# Altium footprint library Generic Footprint.PcbLib: 160 footprints (part 9 of 20) (continued)
## Symbol_CE-Logo-3x2mm_Silkscreen [mm] (continued)
1(1.139,0.104) 1(1.139,0.413) 1(1.145,0.107) 1(1.145,0.11) 1(1.145,0.113) 1(1.145,0.116) 1(1.145,0.119) 1(1.145,0.122) 1(1.145,0.125) 1(1.145,0.128) 1(1.145,0.131) 1(1.145,0.134) 1(1.145,0.137) 1(1.145,0.14) 1(1.145,0.143) 1(1.145,0.146) 1(1.145,0.149) 1(1.145,0.152) 1(1.145,0.155) 1(1.145,0.158) 1(1.145,0.161) 1(1.145,0.164) 1(1.145,0.167) 1(1.145,0.17) 1(1.145,0.173) 1(1.145,0.176) 1(1.145,0.179) 1(1.145,0.182) 1(1.145,0.185) 1(1.145,0.188) 1(1.145,0.191) 1(1.145,0.194) 1(1.145,0.197) 1(1.145,0.2) 1(1.145,0.203) 1(1.145,0.206) 1(1.145,0.209) 1(1.145,0.212) 1(1.145,0.215) 1(1.145,0.218) 1(1.145,0.221) 1(1.145,0.224) 1(1.145,0.227) 1(1.145,0.23) 1(1.145,0.233) 1(1.145,0.236) 1(1.145,0.239) 1(1.145,0.242) 1(1.145,0.245) 1(1.145,0.248) 1(1.145,0.251) 1(1.145,0.254) 1(1.145,0.257) 1(1.145,0.26) 1(1.145,0.263) 1(1.145,0.266) 1(1.145,0.269) 1(1.145,0.272) 1(1.145,0.275) 1(1.145,0.278) 1(1.145,0.281) 1(1.145,0.284) 1(1.145,0.287) 1(1.145,0.29) 1(1.145,0.293) 1(1.145,0.296) 1(1.145,0.299) 1(1.145,0.302) 1(1.145,0.305) 1(1.145,0.308) 1(1.145,0.311) 1(1.145,0.314) 1(1.145,0.317) 1(1.145,0.32) 1(1.145,0.323) 1(1.145,0.326) 1(1.145,0.329) 1(1.145,0.332) 1(1.145,0.335) 1(1.145,0.338) 1(1.145,0.341) 1(1.145,0.344) 1(1.145,0.347) 1(1.145,0.35) 1(1.145,0.353) 1(1.145,0.356) 1(1.145,0.359) 1(1.145,0.362) 1(1.145,0.365) 1(1.145,0.368) 1(1.145,0.371) 1(1.145,0.374) 1(1.145,0.377) 1(1.145,0.38) 1(1.145,0.383) 1(1.145,0.386) 1(1.145,0.389) 1(1.145,0.392) 1(1.145,0.395) 1(1.145,0.398) 1(1.145,0.401) 1(1.145,0.404) 1(1.145,0.407) 1(1.145,0.41) 1(1.145,0.413) 1(1.145,1.883) 1(1.145,1.886) 1(1.145,1.889) 1(1.145,1.892) 1(1.145,1.895) 1(1.145,1.898) 1(1.145,1.901) 1(1.145,1.904) 1(1.145,1.907) 1(1.145,1.91) 1(1.145,1.913) 1(1.145,1.916) 1(1.145,1.919) 1(1.145,1.922) 1(1.145,1.925) 1(1.145,1.928) 1(1.145,1.931) 1(1.145,1.934) 1(1.145,1.937) 1(1.145,1.94) 1(1.145,1.943) 1(1.145,1.946) 1(1.145,1.949) 1(1.145,1.952) 1(1.145,1.955) 1(1.145,1.958) 1(1.145,1.961) 1(1.145,1.964) 1(1.145,1.967) 1(1.145,1.97) 1(1.145,1.973) 1(1.145,1.976) 1(1.145,1.979) 1(1.145,1.982) 1(1.145,1.985) 1(1.145,1.988) 1(1.145,1.991) 1(1.145,1.994) 1(1.145,1.997) 1(1.145,2) 1(1.145,2.003) 1(1.145,2.006) 1(1.145,2.009) 1(1.145,2.012) 1(1.145,2.015) 1(1.145,2.018) 1(1.145,2.021) 1(1.145,2.024) 1(1.145,2.027) 1(1.145,2.03) 1(1.145,2.033) 1(1.145,2.036) 1(1.145,2.039) 1(1.145,2.042) 1(1.145,2.045) 1(1.145,2.048) 1(1.145,2.051) 1(1.145,2.054) 1(1.145,2.057) 1(1.145,2.06) 1(1.145,2.063) 1(1.145,2.066) 1(1.145,2.069) 1(1.145,2.072) 1(1.145,2.075) 1(1.145,2.078) 1(1.145,2.081) 1(1.145,2.084) 1(1.145,2.087) 1(1.145,2.09) 1(1.145,2.093) 1(1.145,2.096) 1(1.145,2.099) 1(1.145,2.102) 1(1.145,2.105) 1(1.145,2.108) 1(1.145,2.111) 1(1.145,2.114) 1(1.145,2.117) 1(1.145,2.12) 1(1.145,2.123) 1(1.145,2.126) 1(1.145,2.129) 1(1.145,2.132) 1(1.145,2.135) 1(1.145,2.138) 1(1.145,2.141) 1(1.145,2.144) 1(1.145,2.147) 1(1.145,2.15) 1(1.145,2.153) 1(1.145,2.156) 1(1.145,2.159) 1(1.145,2.162) 1(1.145,2.165) 1(1.145,2.168) 1(1.145,2.171) 1(1.145,2.174) 1(1.145,2.177) 1(1.145,2.18) 1(1.145,2.183) 1(1.148,2.186) 1(1.781,1.1) 1(1.781,1.103) 1(1.781,1.106) 1(1.781,1.109) 1(1.781,1.112) 1(1.781,1.16) 1(1.781,1.163) 1(1.781,1.166) 1(1.781,1.172) 1(1.781,1.175) 1(1.781,1.178) 1(1.781,1.181) 1(1.781,1.184) 1(1.781,1.187) 1(1.781,1.19) 1(1.781,1.193) 1(1.781,1.196) 1(1.784,1.097) 1(1.784,1.115) 1(1.784,1.118) 1(1.784,1.121) 1(1.784,1.124) 1(1.784,1.127) 1(1.784,1.13) 1(1.784,1.133) 1(1.784,1.136) 1(1.784,1.139) 1(1.784,1.142) 1(1.784,1.145) 1(1.784,1.148) 1(1.784,1.151) 1(1.784,1.154) 1(1.784,1.157) 1(1.787,1.04) 1(1.787,1.043) 1(1.787,1.046) 1(1.787,1.049) 1(1.787,1.052) 1(1.787,1.055) 1(1.787,1.058) 1(1.787,1.061) 1(1.787,1.064) 1(1.787,1.067) 1(1.787,1.07) 1(1.787,1.073) 1(1.787,1.076) 1(1.787,1.079) 1(1.787,1.082) 1(1.787,1.085) 1(1.787,1.088) 1(1.787,1.091) 1(1.787,1.094) 1(1.787,1.169) 1(1.787,1.199) 1(1.787,1.202) 1(1.787,1.205) 1(1.787,1.208) 1(1.787,1.211) 1(1.787,1.214) 1(1.787,1.217) 1(1.787,1.22) 1(1.787,1.223) 1(1.787,1.226) 1(1.787,1.229) 1(1.787,1.232) 1(1.787,1.235) 1(1.787,1.238) 1(1.787,1.241) 1(1.79,1.034) 1(1.79,1.037) 1(1.793,0.986) 1(1.793,0.989) 1(1.793,1.001) 1(1.793,1.01) 1(1.793,1.016) 1(1.793,1.019) 1(1.793,1.022) 1(1.793,1.028) 1(1.793,1.031) 1(1.793,1.244) 1(1.793,1.25) 1(1.793,1.256) 1(1.793,1.259) 1(1.793,1.262) 1(1.793,1.265) 1(1.793,1.268) 1(1.793,1.271) 1(1.793,1.274) 1(1.793,1.277) 1(1.793,1.283) 1(1.793,1.295) 1(1.793,1.304) 1(1.796,0.977) 1(1.796,0.98) 1(1.796,0.983) 1(1.796,0.992) 1(1.796,0.995) 1(1.796,0.998) 1(1.796,1.004) 1(1.796,1.007) 1(1.796,1.013) 1(1.796,1.025) 1(1.796,1.247) 1(1.796,1.253) 1(1.796,1.28) 1(1.796,1.286) 1(1.796,1.289) 1(1.796,1.292) 1(1.796,1.298) 1(1.796,1.301) 1(1.796,1.307) 1(1.799,0.968) 1(1.799,0.971) 1(1.799,0.974) 1(1.799,1.31) 1(1.799,1.313) 1(1.799,1.316) 1(1.799,1.319) 1(1.802,0.938) 1(1.802,0.941) 1(1.802,0.959) 1(1.802,1.322) 1(1.802,1.325) 1(1.802,1.331) 1(1.802,1.343) 1(1.802,1.349) 1(1.805,0.926) 1(1.805,0.929) 1(1.805,0.932) 1(1.805,0.935) 1(1.805,0.944) 1(1.805,0.947) 1(1.805,0.95) 1(1.805,0.953) 1(1.805,0.956) 1(1.805,0.962) 1(1.805,0.965) 1(1.805,1.328) 1(1.805,1.334) 1(1.805,1.337) 1(1.805,1.34) 1(1.805,1.346) 1(1.805,1.352) 1(1.805,1.355) 1(1.805,1.367) 1(1.808,0.92) 1(1.808,0.923) 1(1.808,1.358) 1(1.808,1.361) 1(1.808,1.364) 1(1.811,0.908) 1(1.811,0.917) 1(1.814,0.89) 1(1.814,0.893) 1(1.814,0.896) 1(1.814,0.899) 1(1.814,0.902) 1(1.814,0.905) 1(1.814,0.911) 1(1.814,0.914) 1(1.814,1.37) 1(1.814,1.373) 1(1.814,1.376) 1(1.814,1.379) 1(1.814,1.382) 1(1.814,1.385) 1(1.814,1.388) 1(1.814,1.391) 1(1.814,1.394) 1(1.814,1.403) 1(1.817,0.881) 1(1.817,0.884) 1(1.817,0.887) 1(1.817,1.397) 1(1.817,1.4) 1(1.82,0.878) 1(1.82,1.406) 1(1.823,0.851) 1(1.823,0.857) 1(1.823,0.86) 1(1.823,0.863) 1(1.823,0.866) 1(1.823,0.869) 1(1.823,0.872) 1(1.823,0.875) 1(1.823,1.409) 1(1.823,1.412) 1(1.823,1.415) 1(1.823,1.418) 1(1.823,1.421) 1(1.823,1.424) 1(1.823,1.43) 1(1.823,1.433) 1(1.826,0.854) 1(1.826,1.427) 1(1.832,0.83) 1(1.832,0.839) 1(1.832,0.842) 1(1.832,0.845) 1(1.832,0.848) 1(1.832,1.436) 1(1.832,1.448) 1(1.835,0.821) 1(1.835,0.824) 1(1.835,0.827) 1(1.835,0.833) 1(1.835,0.836) 1(1.835,1.439) 1(1.835,1.442) 1(1.835,1.445) 1(1.835,1.451) 1(1.835,1.454) 1(1.835,1.457) 1(1.835,1.46) 1(1.835,1.463) 1(1.841,0.797) 1(1.841,0.815) 1(1.841,1.466) 1(1.841,1.469) 1(1.841,1.472) 1(1.841,1.481) 1(1.844,0.794) 1(1.844,0.8) 1(1.844,0.803) 1(1.844,0.806) 1(1.844,0.809) 1(1.844,0.812) 1(1.844,0.818) 1(1.844,1.475) 1(1.844,1.478) 1(1.844,1.484) 1(1.844,1.487) 1(1.844,1.49) 1(1.844,1.493) 1(1.85,0.791) 1(1.853,0.767) 1(1.853,0.77) 1(1.853,0.773) 1(1.853,0.776) 1(1.853,0.779) 1(1.853,0.782) 1(1.853,0.785) 1(1.853,0.788) 1(1.853,1.496) 1(1.853,1.499) 1(1.853,1.502) 1(1.853,1.505) 1(1.853,1.508) 1(1.853,1.511) 1(1.853,1.514) 1(1.853,1.517) 1(1.856,0.764) 1(1.856,1.52) 1(1.859,1.523) 1(1.862,0.743) 1(1.862,0.746) 1(1.862,0.749) 1(1.862,0.752) 1(1.862,0.755) 1(1.862,0.758) 1(1.862,0.761) 1(1.862,1.526) 1(1.862,1.529) 1(1.862,1.532) 1(1.862,1.535) 1(1.862,1.538) 1(1.862,1.541) 1(1.865,0.737) 1(1.865,0.74) 1(1.871,0.719) 1(1.871,0.728) 1(1.871,0.734) 1(1.871,1.544) 1(1.871,1.547) 1(1.871,1.55) 1(1.871,1.553) 1(1.871,1.556) 1(1.871,1.559) 1(1.874,0.722) 1(1.874,0.725) 1(1.874,0.731) 1(1.874,1.562) 1(1.874,1.565) 1(1.874,1.568) 1(1.877,0.716) 1(1.88,0.698) 1(1.88,0.704) 1(1.88,0.71) 1(1.88,0.713) 1(1.88,1.571) 1(1.88,1.58) 1(1.883,0.701) 1(1.883,0.707) 1(1.883,1.574) 1(1.883,1.577) 1(1.883,1.583) 1(1.883,1.586) 1(1.883,1.589) 1(1.886,0.695) 1(1.889,0.692) 1(1.892,0.68) 1(1.892,0.683) 1(1.892,0.686) 1(1.892,0.689) 1(1.892,1.592) 1(1.892,1.595) 1(1.892,1.598) 1(1.892,1.601) 1(1.892,1.604) 1(1.892,1.607) 1(1.895,0.677) 1(1.898,0.668) 1(1.898,1.61) 1(1.901,0.659) 1(1.901,0.662) 1(1.901,0.665) 1(1.901,0.671) 1(1.901,0.674) 1(1.901,1.613) 1(1.901,1.616) 1(1.901,1.619) 1(1.901,1.622) 1(1.901,1.625) 1(1.904,1.628) 1(1.91,0.644) 1(1.91,0.647) 1(1.91,0.65) 1(1.91,0.653) 1(1.91,0.656) 1(1.91,1.631) 1(1.91,1.634) 1(1.91,1.637) 1(1.91,1.64) 1(1.913,0.638) 1(1.913,0.641) 1(1.913,1.643) 1(1.913,1.646) 1(1.919,0.623) 1(1.919,0.626) 1(1.919,1.649) 1(1.922,0.629) 1(1.922,0.632) 1(1.922,0.635) 1(1.922,1.652) 1(1.922,1.655) 1(1.925,0.62) 1(1.928,1.658) 1(1.928,1.664) 1(1.931,0.611) 1(1.931,0.614) 1(1.931,0.617) 1(1.931,1.661) 1(1.931,1.667) 1(1.931,1.67) 1(1.931,1.673) 1(1.931,1.676) 1(1.937,0.599) 1(1.937,0.602) 1(1.937,0.608) 1(1.937,1.682) 1(1.94,0.593) 1(1.94,0.596) 1(1.94,0.605) 1(1.94,1.679) 1(1.94,1.685) 1(1.94,1.688) 1(1.94,1.691) 1(1.94,1.694) 1(1.946,0.59) 1(1.949,0.581) 1(1.949,0.584) 1(1.949,0.587) 1(1.949,1.697) 1(1.949,1.7) 1(1.949,1.703) 1(1.958,0.563) 1(1.958,0.566) 1(1.958,0.569) 1(1.958,0.572) 1(1.958,0.575) 1(1.958,0.578) 1(1.958,1.706) 1(1.958,1.709) 1(1.958,1.712) 1(1.958,1.715) 1(1.958,1.718) 1(1.958,1.721) 1(1.958,1.724) 1(1.967,0.56) 1(1.967,1.727) 1(1.967,1.733) 1(1.97,0.554) 1(1.97,0.557) 1(1.97,1.73) 1(1.973,0.551) 1(1.976,0.539) 1(1.976,0.545) 1(1.976,0.548) 1(1.976,1.736) 1(1.976,1.742) 1(1.979,0.533) 1(1.979,0.536) 1(1.979,0.542) 1(1.979,1.739) 1(1.979,1.745) 1(1.979,1.748) 1(1.979,1.751) 1(1.982,1.754) 1(1.988,0.524) 1(1.988,0.527) 1(1.988,0.53) 1(1.988,1.757) 1(1.988,1.76) 1(1.988,1.763) 1(1.994,1.766) 1(1.997,0.515) 1(1.997,0.518) 1(1.997,0.521) 1(1.997,1.769) 1(1.997,1.772) 1(2.006,0.503) 1(2.006,0.506) 1(2.006,0.512) 1(2.006,1.775) 1(2.006,1.778) 1(2.006,1.781) 1(2.006,1.784) 1(2.009,0.497) 1(2.009,0.5) 1(2.009,0.509) 1(2.009,1.787) 1(2.009,1.79) 1(2.012,0.494) 1(2.015,0.488) 1(2.015,0.491) 1(2.015,1.793) 1(2.018,0.485) 1(2.018,1.796) 1(2.018,1.799) 1(2.021,1.802) 1(2.027,0.476) 1(2.027,0.479) 1(2.027,0.482) 1(2.027,1.805) 1(2.027,1.808) 1(2.027,1.811) 1(2.03,0.473) 1(2.036,0.467) 1(2.036,0.47) 1(2.036,1.814) 1(2.036,1.817) 1(2.036,1.82) 1(2.039,0.464) 1(2.045,0.455) 1(2.045,0.458) 1(2.045,0.461) 1(2.045,1.823) 1(2.045,1.826) 1(2.045,1.829) 1(2.054,0.452) 1(2.054,1.832) 1(2.054,1.838) 1(2.057,0.446) 1(2.057,0.449) 1(2.057,1.835) 1(2.063,0.434) 1(2.063,0.437) 1(2.063,0.44) 1(2.063,0.443) 1(2.063,1.841) 1(2.063,1.847) 1(2.066,0.425) 1(2.066,0.428) 1(2.066,0.431) 1(2.066,1.844) 1(2.066,1.85) 1(2.066,1.853) 1(2.066,1.856) 1(2.069,1.859) 1(2.072,0.422) 1(2.075,0.419) 1(2.075,1.862) 1(2.075,1.865) 1(2.075,1.868) 1(2.078,0.416) 1(2.081,0.413) 1(2.081,1.871) 1(2.084,0.41) 1(2.084,1.874) 1(2.084,1.877) 1(2.093,0.401) 1(2.093,0.404) 1(2.093,0.407) 1(2.093,1.88) 1(2.093,1.883) 1(2.093,1.886) 1(2.096,0.398) 1(2.102,0.392) 1(2.102,0.395) 1(2.102,1.889) 1(2.105,0.389) 1(2.105,1.892) 1(2.105,1.895) 1(2.105,1.898) 1(2.108,0.977) 1(2.108,0.986) 1(2.108,0.989) 1(2.108,1.304) 1(2.108,1.307) 1(2.111,0.386) 1(2.111,0.974) 1(2.111,0.98) 1(2.111,0.983) 1(2.111,0.992) 1(2.111,1.301) 1(2.111,1.31) 1(2.114,0.377) 1(2.114,0.38) 1(2.114,0.383) 1(2.114,0.971) 1(2.114,1.313) 1(2.114,1.316) 1(2.114,1.319) 1(2.114,1.901) 1(2.114,1.904) 1(2.117,0.965) 1(2.117,0.995) 1(2.117,1.322) 1(2.117,1.325) 1(2.117,1.907) 1(2.12,0.938) 1(2.12,0.941) 1(2.12,0.944) 1(2.12,0.947) 1(2.12,0.95) 1(2.12,0.953) 1(2.12,0.956) 1(2.12,0.959) 1(2.12,0.962) 1(2.12,0.968) 1(2.12,0.995) 1(2.12,1.301) 1(2.12,1.328) 1(2.12,1.331) 1(2.12,1.334) 1(2.12,1.337) 1(2.12,1.34) 1(2.12,1.343) 1(2.12,1.346) 1(2.12,1.349) 1(2.123,0.374) 1(2.123,0.935) 1(2.123,0.992) 1(2.123,1.301) 1(2.123,1.352) 1(2.126,0.371) 1(2.126,0.932) 1(2.126,0.992) 1(2.126,1.355) 1(2.126,1.358) 1(2.129,0.368) 1(2.129,0.905) 1(2.129,0.908) 1(2.129,0.911) 1(2.129,0.914) 1(2.129,0.917) 1(2.129,0.92) 1(2.129,0.923) 1(2.129,0.926) 1(2.129,0.929) 1(2.129,1.361) 1(2.129,1.364) 1(2.129,1.367) 1(2.129,1.37) 1(2.129,1.373) 1(2.129,1.376) 1(2.129,1.379) 1(2.132,1.91) 1(2.132,1.913) 1(2.132,1.916) 1(2.135,1.382) 1(2.135,1.385) 1(2.138,0.881) 1(2.138,0.884) 1(2.138,0.887) 1(2.138,0.89) 1(2.138,0.893) 1(2.138,0.896) 1(2.138,0.899) 1(2.138,0.902) 1(2.138,1.388) 1(2.138,1.391) 1(2.138,1.394) 1(2.138,1.397) 1(2.138,1.4) 1(2.138,1.403) 1(2.138,1.406) 1(2.138,1.409) 1(2.141,0.359) 1(2.141,0.362) 1(2.141,0.365) 1(2.141,0.878) 1(2.141,1.919) 1(2.141,1.922) 1(2.141,1.925) 1(2.144,1.412) 1(2.147,0.86) 1(2.147,0.863) 1(2.147,0.866) 1(2.147,0.869) 1(2.147,0.872) 1(2.147,1.415) 1(2.147,1.418) 1(2.147,1.421) 1(2.147,1.424) 1(2.147,1.427) 1(2.147,1.43) 1(2.147,1.433) 1(2.147,1.436) 1(2.15,0.35) 1(2.15,0.353) 1(2.15,0.356) 1(2.15,0.857) 1(2.15,0.875) 1(2.15,1.439) 1(2.15,1.928) 1(2.15,1.931) 1(2.15,1.934) 1(2.15,1.937) 1(2.153,0.857) 1(2.153,1.439) 1(2.153,1.937) 1(2.156,0.848) 1(2.156,0.851) 1(2.156,0.854) 1(2.156,0.857) 1(2.156,1.439) 1(2.159,0.347) 1(2.159,0.83) 1(2.159,0.833) 1(2.159,0.836) 1(2.159,0.839) 1(2.159,0.842) 1(2.159,0.845) 1(2.159,1.442) 1(2.159,1.445) 1(2.159,1.448) 1(2.159,1.451) 1(2.159,1.454) 1(2.159,1.457) 1(2.159,1.937) 1(2.159,1.94) 1(2.159,1.943) 1(2.162,0.341) 1(2.162,0.344) 1(2.162,1.946) 1(2.168,0.809) 1(2.168,0.812) 1(2.168,0.815) 1(2.168,0.818) 1(2.168,0.821) 1(2.168,0.824) 1(2.168,0.827) 1(2.168,1.46) 1(2.168,1.463) 1(2.168,1.466) 1(2.168,1.469) 1(2.168,1.472) 1(2.168,1.475) 1(2.171,0.332) 1(2.171,0.335) 1(2.171,0.338) 1(2.171,1.949) 1(2.171,1.952) 1(2.171,1.955) 1(2.174,0.329) 1(2.174,1.478) 1(2.177,0.329) 1(2.177,0.791) 1(2.177,0.794) 1(2.177,0.797) 1(2.177,0.8) 1(2.177,0.803) 1(2.177,0.806) 1(2.177,1.481) 1(2.177,1.484) 1(2.177,1.487) 1(2.177,1.49) 1(2.177,1.493) 1(2.18,0.323) 1(2.18,0.326) 1(2.18,0.329) 1(2.18,1.958) 1(2.18,1.961) 1(2.183,0.32) 1(2.183,1.496) 1(2.183,1.964) 1(2.186,0.782) 1(2.186,0.785) 1(2.186,0.788) 1(2.186,1.499) 1(2.186,1.502) 1(2.186,1.505) 1(2.186,1.511) 1(2.186,1.514) 1(2.189,1.508) 1(2.192,0.32) 1(2.192,0.779) 1(2.195,0.32) 1(2.195,0.764) 1(2.195,0.77) 1(2.195,0.773) 1(2.195,0.776) 1(2.195,1.517) 1(2.195,1.52) 1(2.195,1.523) 1(2.198,0.311) 1(2.198,0.317) 1(2.198,0.761) 1(2.198,0.767) 1(2.198,1.526) 1(2.198,1.967) 1(2.198,1.97) 1(2.198,1.973) 1(2.201,0.314) 1(2.204,0.758) 1(2.207,0.308) 1(2.207,0.743) 1(2.207,0.746) 1(2.207,0.749) 1(2.207,0.752) 1(2.207,0.755) 1(2.207,1.529) 1(2.207,1.532) 1(2.207,1.535) 1(2.207,1.538) 1(2.207,1.541) 1(2.207,1.544) 1(2.207,1.976) 1(2.21,0.302) 1(2.21,0.305) 1(2.21,1.979) 1(2.21,1.982) 1(2.21,1.985) 1(2.216,0.734) 1(2.216,0.737) 1(2.216,0.74) 1(2.216,1.547) 1(2.216,1.55) 1(2.216,1.553) 1(2.216,1.988) 1(2.219,0.293) 1(2.219,0.296) 1(2.219,0.299) 1(2.219,1.991) 1(2.222,0.731) 1(2.222,1.556) 1(2.222,1.994) 1(2.225,0.713) 1(2.225,0.716) 1(2.225,0.719) 1(2.225,0.722) 1(2.225,0.725) 1(2.225,0.728) 1(2.225,1.559) 1(2.225,1.562) 1(2.225,1.565) 1(2.225,1.568) 1(2.225,1.571) 1(2.228,0.29) 1(2.231,0.29) 1(2.231,1.574) 1(2.234,0.29) 1(2.234,0.707) 1(2.234,0.71) 1(2.234,1.577) 1(2.234,1.58) 1(2.237,0.284) 1(2.237,0.704) 1(2.237,1.997) 1(2.237,2) 1(2.237,2.003) 1(2.24,0.281) 1(2.24,0.287) 1(2.24,1.583) 1(2.243,0.701) 1(2.243,1.586) 1(2.243,1.589) 1(2.243,1.598) 1(2.246,0.278) 1(2.246,0.695) 1(2.246,0.698) 1(2.246,1.592) 1(2.246,1.595) 1(2.246,1.601) 1(2.246,2.006) 1(2.249,0.275) 1(2.249,2.009) 1(2.249,2.012) 1(2.252,0.272) 1(2.252,0.689) 1(2.252,0.692) 1(2.255,0.674) 1(2.255,0.677) 1(2.255,0.68) 1(2.255,0.683) 1(2.255,0.686) 1(2.255,1.604) 1(2.255,1.607) 1(2.255,1.61) 1(2.258,0.272) 1(2.261,0.272) 1(2.264,0.668) 1(2.264,0.671) 1(2.264,1.613) 1(2.264,1.616) 1(2.264,1.619) 1(2.264,2.015) 1(2.267,0.263) 1(2.267,0.266) 1(2.267,0.269) 1(2.267,0.665) 1(2.267,1.622) 1(2.267,2.018) 1(2.267,2.021) 1(2.27,1.622) 1(2.273,0.656) 1(2.273,0.659) 1(2.273,0.662) 1(2.273,1.622) 1(2.273,1.625) 1(2.273,1.628) 1(2.273,2.024) 1(2.276,0.257) 1(2.276,0.26) 1(2.276,2.027) 1(2.276,2.03) 1(2.279,1.631) 1(2.279,2.033) 1(2.282,0.254) 1(2.282,0.65) 1(2.282,0.653) 1(2.282,1.634) 1(2.282,1.637) 1(2.285,0.647) 1(2.285,1.64) 1(2.291,0.638) 1(2.291,0.644) 1(2.291,1.643) 1(2.291,1.649) 1(2.294,0.251) 1(2.294,0.641) 1(2.294,1.646) 1(2.294,2.036) 1(2.294,2.039) 1(2.297,0.245) 1(2.297,0.248) 1(2.297,0.635) 1(2.297,2.042) 1(2.3,0.635) 1(2.3,1.652) 1(2.303,0.626) 1(2.303,0.629) 1(2.303,0.632) 1(2.303,0.635) 1(2.303,1.655) 1(2.303,1.658) 1(2.303,2.045) 1(2.306,0.242) 1(2.306,1.661) 1(2.306,2.048) 1(2.309,0.242) 1(2.309,0.992) 1(2.309,2.051) 1(2.312,0.242) 1(2.312,0.617) 1(2.312,0.62) 1(2.312,0.623) 1(2.312,0.992) 1(2.312,1.664) 1(2.312,1.667) 1(2.315,0.233) 1(2.315,0.236) 1(2.315,0.239) 1(2.315,1.67) 1(2.321,0.608) 1(2.321,0.611) 1(2.321,0.614) 1(2.321,0.992) 1(2.321,1.673) 1(2.321,1.676) 1(2.321,1.679) 1(2.321,2.054) 1(2.324,0.23) 1(2.324,2.057) 1(2.324,2.06) 1(2.327,0.227) 1(2.327,0.992) 1(2.33,0.605) 1(2.33,0.992) 1(2.33,1.682) 1(2.33,1.685) 1(2.333,0.599) 1(2.333,0.602) 1(2.333,0.992) 1(2.333,1.688) 1(2.336,0.224) 1(2.336,2.063) 1(2.339,2.063) 1(2.342,0.587) 1(2.342,0.59) 1(2.342,0.593) 1(2.342,0.596) 1(2.342,1.691) 1(2.342,1.694) 1(2.342,1.697) 1(2.345,0.218) 1(2.345,0.221) 1(2.345,2.063) 1(2.345,2.066) 1(2.345,2.069) 1(2.348,0.215) 1(2.351,0.578) 1(2.351,0.581) 1(2.351,0.584) 1(2.351,1.7) 1(2.351,1.703) 1(2.351,1.706) 1(2.351,2.072) 1(2.357,0.992) 1(2.36,0.569) 1(2.36,0.572) 1(2.36,0.575) 1(2.36,0.992) 1(2.36,1.709) 1(2.36,1.712) 1(2.36,1.715) 1(2.36,2.072) 1(2.363,0.209) 1(2.363,0.212) 1(2.363,1.718) 1(2.363,2.072) 1(2.363,2.075) 1(2.366,0.206) 1(2.366,1.718) 1(2.366,2.078) 1(2.366,2.081) 1(2.369,0.992) 1(2.369,1.718) 1(2.369,1.721) 1(2.369,1.724) 1(2.372,1.727) 1(2.375,0.992) 1(2.378,0.563) 1(2.378,0.566) 1(2.381,0.2) 1(2.381,0.203) 1(2.381,0.56) 1(2.381,2.084) 1(2.384,2.087) 1(2.384,2.09) 1(2.387,0.197) 1(2.387,0.557) 1(2.387,1.73) 1(2.39,0.551) 1(2.39,0.554) 1(2.39,1.733) 1(2.39,1.736) 1(2.393,0.194) 1(2.396,0.194) 1(2.399,0.194) 1(2.399,0.539) 1(2.399,0.542) 1(2.399,0.545) 1(2.399,0.548) 1(2.399,1.739) 1(2.399,1.742) 1(2.399,1.745) 1(2.402,0.191) 1(2.402,1.748) 1(2.402,2.093) 1(2.402,2.096) 1(2.405,0.188) 1(2.405,1.748) 1(2.405,2.099) 1(2.408,1.748) 1(2.408,1.751) 1(2.408,1.754) 1(2.411,0.185) 1(2.411,1.757) 1(2.414,1.757) 1(2.417,0.533) 1(2.417,0.536) 1(2.42,0.53) 1(2.42,2.102) 1(2.423,2.105) 1(2.426,1.757) 1(2.426,1.763) 1(2.426,2.108) 1(2.426,2.111) 1(2.429,0.176) 1(2.429,0.179) 1(2.429,0.182) 1(2.429,0.521) 1(2.429,0.524) 1(2.429,0.527) 1(2.429,1.76) 1(2.429,1.766) 1(2.429,2.111) 1(2.432,0.176) 1(2.432,1.766) 1(2.435,0.176) 1(2.438,1.766) 1(2.438,1.769) 1(2.438,1.772) 1(2.438,1.775) 1(2.444,0.518) 1(2.447,0.512) 1(2.447,0.515) 1(2.447,2.111) 1(2.45,0.17) 1(2.45,0.173) 1(2.45,2.114) 1(2.45,2.117) 1(2.453,0.167) 1(2.456,1.778) 1(2.456,1.781) 1(2.456,1.784) 1(2.456,2.12) 1(2.459,0.509) 1(2.465,0.506) 1(2.468,0.503) 1(2.471,0.5) 1(2.471,2.123) 1(2.471,2.126) 1(2.474,0.5) 1(2.474,1.787) 1(2.477,0.164) 1(2.477,0.491) 1(2.477,0.494) 1(2.477,0.497) 1(2.477,0.5) 1(2.477,1.79) 1(2.477,1.793) 1(2.477,1.796) 1(2.477,2.129) 1(2.48,0.158) 1(2.48,0.161) 1(2.48,1.796) 1(2.486,1.796) 1(2.495,0.482) 1(2.495,0.485) 1(2.495,0.488) 1(2.495,1.799) 1(2.495,1.802) 1(2.498,2.132) 1(2.498,2.135) 1(2.501,1.805) 1(2.501,2.138) 1(2.507,0.149) 1(2.507,0.152) 1(2.507,0.155) 1(2.51,1.808) 1(2.516,0.146) 1(2.516,0.473) 1(2.516,0.476) 1(2.516,0.479) 1(2.516,1.811) 1(2.519,1.814) 1(2.525,2.141) 1(2.525,2.144) 1(2.528,0.47) 1(2.531,0.47) 1(2.531,0.992) 1(2.531,2.147) 1(2.534,0.464) 1(2.534,0.467) 1(2.534,0.47) 1(2.534,0.992) 1(2.534,1.817) 1(2.534,1.82) 1(2.537,0.14) 1(2.537,0.143) 1(2.537,1.823) 1(2.546,0.992) 1(2.549,0.137) 1(2.549,0.992) 1(2.552,1.826) 1(2.552,1.829) 1(2.552,1.832) 1(2.552,2.15) 1(2.555,0.461) 1(2.555,2.15) 1(2.561,0.458) 1(2.564,0.134) 1(2.564,0.452) 1(2.564,0.455) 1(2.564,2.15) 1(2.564,2.153) 1(2.564,2.156) 1(2.567,0.131) 1(2.567,1.835) 1(2.57,0.452) 1(2.57,0.992) 1(2.57,1.835) 1(2.573,0.992) 1(2.576,0.128) 1(2.576,0.452) 1(2.576,1.835) 1(2.579,0.128) 1(2.579,2.159) 1(2.582,1.838) 1(2.585,0.128) 1(2.585,0.449) 1(2.585,1.841) 1(2.591,0.443) 1(2.591,0.446) 1(2.594,2.162) 1(2.597,1.844) 1(2.603,0.125) 1(2.606,0.122) 1(2.606,2.165) 1(2.609,0.44) 1(2.609,1.847) 1(2.612,1.85) 1(2.612,2.168) 1(2.621,0.119) 1(2.621,0.434) 1(2.621,0.437) 1(2.621,1.853) 1(2.636,1.856) 1(2.639,1.859) 1(2.642,1.862) 1(2.642,2.171) 1(2.645,0.431) 1(2.645,1.862) 1(2.645,2.174) 1(2.648,1.862) 1(2.651,0.113) 1(2.651,0.116) 1(2.651,0.425) 1(2.651,0.428) 1(2.657,2.177) 1(2.66,0.107) 1(2.66,0.11) 1(2.663,0.107) 1(2.663,0.11) 1(2.666,0.107) 1(2.666,0.11) 1(2.672,0.107) 1(2.672,1.865) 1(2.675,1.862) 1(2.675,1.865) 1(2.678,1.862) 1(2.678,1.865) 1(2.678,1.868) 1(2.678,1.871) 1(2.684,0.422) 1(2.687,0.107) 1(2.693,0.419) 1(2.699,0.104) 1(2.699,0.413) 1(2.699,0.416) 1(2.699,2.18) 1(2.699,2.183) 1(2.699,2.186) 1(2.702,0.104) 1(2.705,0.101) 1(2.705,0.104) 1(2.705,2.186) 1(2.708,0.101) 1(2.708,0.104) 1(2.708,0.107) 1(2.711,0.107) 1(2.711,0.413) 1(2.711,1.874) 1(2.714,0.107) 1(2.714,0.413) 1(2.714,2.186) 1(2.717,0.107) 1(2.717,0.413) 1(2.723,0.413) 1(2.726,0.413) 1(2.726,1.265) 1(2.726,1.271) 1(2.729,0.104) 1(2.732,0.413) 1(2.732,0.995) 1(2.732,0.998) 1(2.732,1.001) 1(2.732,1.004) 1(2.732,1.007) 1(2.732,1.01) 1(2.732,1.013) 1(2.732,1.016) 1(2.732,1.019) 1(2.732,1.022) 1(2.732,1.025) 1(2.732,1.028) 1(2.732,1.031) 1(2.732,1.034) 1(2.732,1.037) 1(2.732,1.04) 1(2.732,1.043) 1(2.732,1.046) 1(2.732,1.049) 1(2.732,1.052) 1(2.732,1.055) 1(2.732,1.058) 1(2.732,1.061) 1(2.732,1.064) 1(2.732,1.067) 1(2.732,1.07) 1(2.732,1.073) 1(2.732,1.076) 1(2.732,1.079) 1(2.732,1.082) 1(2.732,1.085) 1(2.732,1.088) 1(2.732,1.091) 1(2.732,1.094) 1(2.732,1.097) 1(2.732,1.1) 1(2.732,1.103) 1(2.732,1.106) 1(2.732,1.109) 1(2.732,1.112) 1(2.732,1.115) 1(2.732,1.118) 1(2.732,1.121) 1(2.732,1.124) 1(2.732,1.127) 1(2.732,1.13) 1(2.732,1.133) 1(2.732,1.136) 1(2.732,1.139) 1(2.732,1.142) 1(2.732,1.145) 1(2.732,1.148) 1(2.732,1.151) 1(2.732,1.154) 1(2.732,1.157) 1(2.732,1.16) 1(2.732,1.163) 1(2.732,1.166) 1(2.732,1.169) 1(2.732,1.172) 1(2.732,1.175) 1(2.732,1.178) 1(2.732,1.181) 1(2.732,1.184) 1(2.732,1.187) 1(2.732,1.19) 1(2.732,1.193) 1(2.732,1.196) 1(2.732,1.199) 1(2.732,1.202) 1(2.732,1.205) 1(2.732,1.208) 1(2.732,1.211) 1(2.732,1.214) 1(2.732,1.217) 1(2.732,1.22) 1(2.732,1.223) 1(2.732,1.226) 1(2.732,1.229) 1(2.732,1.232) 1(2.732,1.235) 1(2.732,1.238) 1(2.732,1.241) 1(2.732,1.244) 1(2.732,1.247) 1(2.732,1.25) 1(2.732,1.253) 1(2.732,1.256) 1(2.732,1.259) 1(2.732,1.262) 1(2.732,1.268) 1(2.732,1.274) 1(2.732,1.277) 1(2.732,1.28) 1(2.732,1.283) 1(2.732,1.286) 1(2.732,1.289) 1(2.732,1.292) 1(2.732,1.295) 1(2.732,1.298) 1(2.735,1.877) 1(2.738,1.88) 1(2.747,0.413) 1(2.747,1.883) 1(2.75,1.883) 1(2.756,0.101) 1(2.756,0.41) 1(2.756,0.413) 1(2.765,2.189) 1(2.774,0.098) 1(2.774,0.407) 1(2.777,0.404) 1(2.777,2.189) 1(2.78,0.098) 1(2.78,1.883) 1(2.783,0.098) 1(2.783,1.883) 1(2.786,1.88) 1(2.789,2.189) 1(2.792,2.189) 1(2.795,0.098) 1(2.795,1.88) 1(2.795,2.189) 1(2.798,0.098) 1(2.798,1.883) 1(2.801,0.098) 1(2.804,0.098) 1(2.804,0.404) 1(2.807,0.095) 1(2.81,0.095) 1(2.81,2.189) 1(2.819,2.189) 1(2.825,2.189) 1(2.834,2.189) 1(2.852,2.192) 1(2.858,0.095) 1(2.861,0.095) 1(2.861,2.192) 1(2.864,0.098) 1(2.864,2.189) 1(2.867,0.098) 1(2.867,2.189) 1(2.87,2.189) 1(2.873,2.189) 1(2.879,1.883) 1(2.882,0.404) 1(2.882,1.88) 1(2.891,0.404) 1(2.894,0.098) 1(2.894,0.407) 1(2.894,1.88) 1(2.894,1.883) 1(2.897,1.883) 1(2.9,2.189) 1(2.903,0.098) 1(2.906,0.098) 1(2.909,2.189) 1(2.912,0.41) 1(2.912,0.413) 1(2.912,2.189) 1(2.921,0.413) 1(2.924,0.101) 1(2.936,0.104) 1(2.936,0.107) 1(2.936,0.11) 1(2.936,0.113) 1(2.936,0.116) 1(2.936,0.119) 1(2.936,0.122) 1(2.936,0.125) 1(2.936,0.128) 1(2.936,0.131) 1(2.936,0.134) 1(2.936,0.137) 1(2.936,0.14) 1(2.936,0.143) 1(2.936,0.146) 1(2.936,0.149) 1(2.936,0.152) 1(2.936,0.155) 1(2.936,0.158) 1(2.936,0.161) 1(2.936,0.164) 1(2.936,0.167) 1(2.936,0.17) 1(2.936,0.173) 1(2.936,0.176) 1(2.936,0.179) 1(2.936,0.182) 1(2.936,0.185) 1(2.936,0.188) 1(2.936,0.191) 1(2.936,0.194) 1(2.936,0.197) 1(2.936,0.2) 1(2.936,0.203) 1(2.936,0.206) 1(2.936,0.209) 1(2.936,0.212) 1(2.936,0.215) 1(2.936,0.218) 1(2.936,0.221) 1(2.936,0.224) 1(2.936,0.227) 1(2.936,0.23) 1(2.936,0.233) 1(2.936,0.236) 1(2.936,0.239) 1(2.936,0.242) 1(2.936,0.245) 1(2.936,0.248) 1(2.936,0.251) 1(2.936,0.254) 1(2.936,0.26) 1(2.936,0.263) 1(2.936,0.266) 1(2.936,0.272) 1(2.936,0.275) 1(2.936,0.278) 1(2.936,0.281) 1(2.936,0.284) 1(2.936,0.287) 1(2.936,0.293) 1(2.936,0.296) 1(2.936,0.299) 1(2.936,0.302) 1(2.936,0.305) 1(2.936,0.308) 1(2.936,0.311) 1(2.936,0.314) 1(2.936,0.317) 1(2.936,0.32) 1(2.936,0.323) 1(2.936,0.326) 1(2.936,0.329) 1(2.936,0.332) 1(2.936,0.335) 1(2.936,0.338) 1(2.936,0.341) 1(2.936,0.344) 1(2.936,0.347) 1(2.936,0.35) 1(2.936,0.353) 1(2.936,0.356) 1(2.936,0.359) 1(2.936,0.362) 1(2.936,0.365) 1(2.936,0.368) 1(2.936,0.371) 1(2.936,0.374) 1(2.936,0.377) 1(2.936,0.38) 1(2.936,0.383) 1(2.936,0.386) 1(2.936,0.389) 1(2.936,0.392) 1(2.936,0.395) 1(2.936,0.398) 1(2.936,0.401) 1(2.936,0.404) 1(2.936,0.407) 1(2.936,0.41) 1(2.939,0.257) 1(2.939,0.269) 1(2.939,0.29) 1(2.939,1.883) 1(2.939,1.889) 1(2.939,1.892) 1(2.939,1.895) 1(2.939,1.901) 1(2.939,1.904) 1(2.939,1.907) 1(2.939,1.91) 1(2.939,1.913) 1(2.939,1.916) 1(2.939,1.919) 1(2.939,1.922) 1(2.939,1.925) 1(2.939,1.928) 1(2.939,1.931) 1(2.939,1.934) 1(2.939,1.937) 1(2.939,1.94) 1(2.939,1.943) 1(2.939,1.946) 1(2.939,1.949) 1(2.939,1.952) 1(2.939,1.955) 1(2.939,1.958) 1(2.939,1.961) 1(2.939,1.964) 1(2.939,1.967) 1(2.939,1.97) 1(2.939,1.973) 1(2.939,1.976) 1(2.939,1.979) 1(2.939,1.982) 1(2.939,1.985) 1(2.939,1.988) 1(2.939,1.994) 1(2.939,1.997) 1(2.939,2) 1(2.939,2.003) 1(2.939,2.006) 1(2.939,2.009) 1(2.939,2.012) 1(2.939,2.018) 1(2.939,2.021) 1(2.939,2.024) 1(2.939,2.03) 1(2.939,2.033) 1(2.939,2.036) 1(2.939,2.039) 1(2.939,2.045) 1(2.939,2.048) 1(2.939,2.051) 1(2.939,2.054) 1(2.939,2.057) 1(2.939,2.06) 1(2.939,2.063) 1(2.939,2.069) 1(2.939,2.072) 1(2.939,2.075) 1(2.939,2.078) 1(2.939,2.081) 1(2.939,2.084) 1(2.939,2.087) 1(2.939,2.09) 1(2.939,2.093) 1(2.939,2.096) 1(2.939,2.099) 1(2.939,2.105) 1(2.939,2.108) 1(2.939,2.111) 1(2.939,2.117) 1(2.939,2.12) 1(2.939,2.123) 1(2.939,2.126) 1(2.939,2.129) 1(2.939,2.132) 1(2.939,2.135) 1(2.939,2.141) 1(2.939,2.144) 1(2.939,2.147) 1(2.939,2.15) 1(2.939,2.156) 1(2.939,2.159) 1(2.939,2.162) 1(2.939,2.165) 1(2.939,2.171) 1(2.939,2.174) 1(2.939,2.177) 1(2.939,2.18) 1(2.939,2.183) 1(2.939,2.186) 1(2.942,1.886) 1(2.942,1.898) 1(2.942,1.991) 1(2.942,2.015) 1(2.942,2.027) 1(2.942,2.042) 1(2.942,2.066) 1(2.942,2.102) 1(2.942,2.114) 1(2.942,2.138) 1(2.942,2.153) 1(2.942,2.168)
Top Overlay:
  drawing of 1554 lines, arcs and shapes, not listed